# Altium footprint library Common Components.PcbLib: 94 footprints (part 5 of 6)
Each footprint in its own frame and in the unit in brackets; x right, y up, seen from the top. Pads: shape width x height; smd on the part's side, far side on the other; paste and mask are expansions set on the pad; w line width, h text height; cw(c..) or ccw(c..) is an arc to the next point about the centre after c.
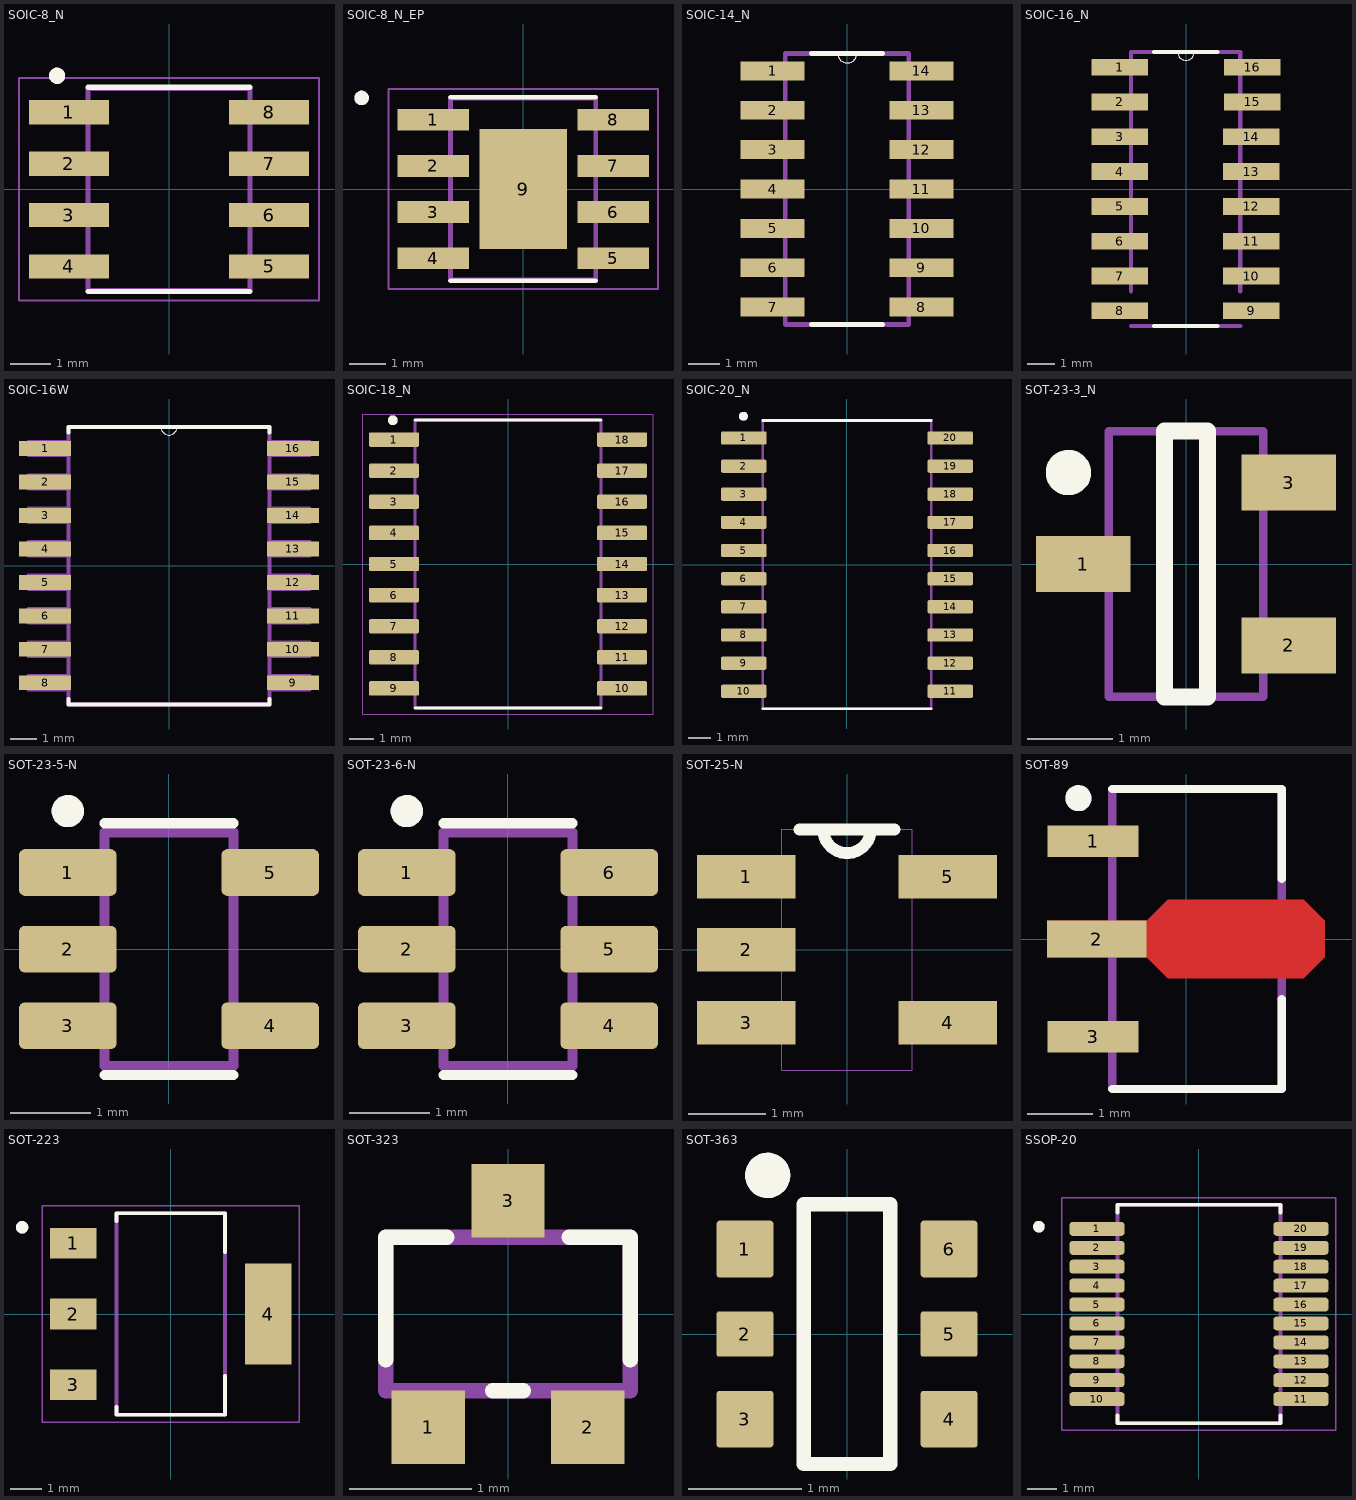
[diagram p4: the footprints below, top view; thin cyan lines are the x and y axes]

## SOIC-8_N [mm]
pads (8):
  rect 1.97x0.6 smd: 1(-2.475,1.905) 2(-2.475,0.635) 3(-2.475,-0.635) 4(-2.475,-1.905) 5(2.475,-1.905) 6(2.475,-0.635) 7(2.475,0.635) 8(2.475,1.905)
Top Overlay:
  circle w0.2: c-2.769,2.81 r0.1
  lines w0.127: -2,-2.525 2,-2.525 ; -2,2.525 2,2.525
Mechanical 13:
  circle w0.2: c-2.769,2.81 r0.1
  circle w0.2: c-2.769,2.81 r0.1
  lines w0.127: -2,-2.5 -2,2.5 ; -2,-2.5 2,-2.5 ; -2,-2.5 -2,2.5 ; -2,-2.5 2,-2.5 ; -2,2.5 2,2.5 ; -2,2.5 2,2.5 ; 2,-2.5 2,2.5 ; 2,-2.5 2,2.5
Mechanical 15:
  lines w0.05: -3.71,-2.75 -3.71,2.75 3.71,2.75 3.71,-2.75 -3.71,-2.75
3D body "SOIC-8.step": height 1.75, standoff 0, extent -3,-2.45 3,2.45

## SOIC-8_N_EP [mm]
pads (9):
  rect 1.97x0.6 smd: 1(-2.475,1.905) 2(-2.475,0.635) 3(-2.475,-0.635) 4(-2.475,-1.905) 5(2.475,-1.905) 6(2.475,-0.635) 7(2.475,0.635) 8(2.475,1.905)
  rect 2.41x3.3 smd: 9(0,0)
Top Overlay:
  circle w0.2: c-4.445,2.505 r0.1
  lines w0.127: -2,-2.525 2,-2.525 ; -2,2.525 2,2.525
Top Paste:
  region: -0.76,1.04 0.76,1.04 0.76,-1.04 -0.76,-1.04
Mechanical 13:
  circle w0.2: c-4.445,2.505 r0.1
  circle w0.2: c-4.445,2.505 r0.1
  lines w0.127: -2,-2.5 -2,2.5 ; -2,-2.5 2,-2.5 ; -2,-2.5 -2,2.5 ; -2,-2.5 2,-2.5 ; -2,2.5 2,2.5 ; -2,2.5 2,2.5 ; 2,-2.5 2,2.5 ; 2,-2.5 2,2.5
Mechanical 15:
  lines w0.05: -3.71,-2.75 -3.71,2.75 3.71,2.75 3.71,-2.75 -3.71,-2.75
3D body "SOIC-8.step": height 1.75, standoff 0, extent -3,-2.45 3,2.45

## SOIC-14_N [mil]
pads (14):
  rect 81x24 smd: 1(-94.5,150) 2(-94.5,100) 3(-94.5,50) 4(-94.5,0) 5(-94.5,-50) 6(-94.5,-100) 7(-94.5,-150) 8(94.5,-150) 9(94.5,-100) 10(94.5,-50) 11(94.5,0) 12(94.5,50) 13(94.5,100) 14(94.5,150)
Top Overlay:
  lines w0: -11.5,172 ccw(c0.5,172) 12.5,172
  lines w6: -45.5,-172 45.5,-172 ; -45.5,172 -11.5,172 12.5,172 45.5,172
Mechanical 13:
  lines w0: -11.5,172 ccw(c0.5,172) 12.5,172 cw(c0.5,172) -11.5,172
  lines w6: -78.5,-172 -78.5,172 ; -78.5,-172 78.5,-172 ; -78.5,-172 -78.5,172 ; -78.5,-172 78.5,-172 ; -78.5,172 -11.5,172 ; -78.5,172 -11.5,172 ; -11.5,172 12.5,172 ; -11.5,172 12.5,172 ; 12.5,172 78.5,172 ; 12.5,172 78.5,172 ; 78.5,-172 78.5,172 ; 78.5,-172 78.5,172 ; -94.5,-150 -78.5,-150 -94.5,-150 ; -94.5,-100 -78.5,-100 -94.5,-100 ; -94.5,-50 -78.5,-50 -94.5,-50 ; -94.5,0 -78.5,0 -94.5,0 ; -94.5,50 -78.5,50 -94.5,50 ; -94.5,100 -78.5,100 -94.5,100 ; -94.5,150 -78.5,150 -94.5,150 ; 78.5,-150 94.5,-150 78.5,-150 ; 78.5,-100 94.5,-100 78.5,-100 ; 78.5,-50 94.5,-50 78.5,-50 ; 78.5,0 94.5,0 78.5,0 ; 78.5,50 94.5,50 78.5,50 ; 78.5,100 94.5,100 78.5,100 ; 78.5,150 94.5,150 78.5,150
3D body "SOIC-14.step": height 68.9, standoff 0, extent -118.11,-172.25 118.11,172.24

## SOIC-16_N [mil]
pads (16):
  rect 81x24 smd: 1(-95,175) 2(-95,125) 3(-95,75) 4(-95,25) 5(-95,-25) 6(-95,-75) 7(-95,-125) 8(-95,-175) 9(94,-175) 10(94,-125) 11(94,-75) 12(94,-25) 13(94,25) 14(94,75) 15(95,125) 16(95,175)
Top Overlay:
  lines w0: -12,197 ccw(c0,197) 12,197
  lines w6: -46,-197 45,-197 ; -46,197 -12,197 12,197 45,197
Mechanical 13:
  lines w0: -12,197 ccw(c0,197) 12,197 cw(c0,197) -12,197
  lines w6: -79,197 -79,-147 -79,197 ; -79,197 -12,197 ; -79,197 -12,197 ; -12,197 12,197 ; -12,197 12,197 ; 12,197 78,197 ; 12,197 78,197 ; 78,197 78,-147 78,197 ; -95,-125 -79,-125 -95,-125 ; -95,-75 -79,-75 -95,-75 ; -95,-25 -79,-25 -95,-25 ; -95,25 -79,25 -95,25 ; -95,75 -79,75 -95,75 ; -95,125 -79,125 -95,125 ; -95,175 -79,175 -95,175 ; -79,-197 78,-197 -79,-197 ; 78,-125 94,-125 78,-125 ; 78,-75 94,-75 78,-75 ; 78,-25 94,-25 78,-25 ; 78,25 94,25 78,25 ; 78,75 94,75 78,75 ; 78,125 94,125 78,125 ; 78,175 94,175 78,175
3D body "SOIC-16.step": height 66.93, standoff 0, extent -118.1,-200.78 118.11,200.79

## SOIC-16W [mil]
pads (16):
  rect 78x22 smd: 1(-185,175) 2(-185,125) 3(-185,75) 4(-185,25) 5(-185,-25) 6(-185,-75) 7(-185,-125) 8(-185,-175) 9(185,-175) 10(185,-125) 11(185,-75) 12(185,-25) 13(185,25) 14(185,75) 15(185,125) 16(185,175)
Top Overlay:
  lines w0: -12,207 ccw(c0,207) 12,207
  lines w6: -150,-199 -150,-207 150,-207 150,-199 ; -150,199 -150,207 -12,207 12,207 150,207 150,199
Mechanical 13:
  lines w0: -12,207 ccw(c0,207) 12,207 cw(c0,207) -12,207
  lines w6: -210,-185 -210,-165 ; -210,-185 -150,-185 ; -210,-185 -210,-165 ; -210,-185 -150,-185 ; -210,-165 -150,-165 ; -210,-165 -150,-165 ; -210,-135 -210,-115 ; -210,-135 -150,-135 ; -210,-135 -210,-115 ; -210,-135 -150,-135 ; -210,-115 -150,-115 ; -210,-115 -150,-115 ; -210,-85 -210,-65 ; -210,-85 -150,-85 ; -210,-85 -210,-65 ; -210,-85 -150,-85 ; -210,-65 -150,-65 ; -210,-65 -150,-65 ; -210,-35 -210,-15 ; -210,-35 -150,-35 ; -210,-35 -210,-15 ; -210,-35 -150,-35 ; -210,-15 -150,-15 ; -210,-15 -150,-15 ; -210,15 -210,35 ; -210,15 -150,15 ; -210,15 -210,35 ; -210,15 -150,15 ; -210,35 -150,35 ; -210,35 -150,35 ; -210,65 -210,85 ; -210,65 -150,65 ; -210,65 -210,85 ; -210,65 -150,65 ; -210,85 -150,85 ; -210,85 -150,85 ; -210,115 -210,135 ; -210,115 -150,115 ; -210,115 -210,135 ; -210,115 -150,115 ; -210,135 -150,135 ; -210,135 -150,135 ; -210,165 -210,185 ; -210,165 -150,165 ; -210,165 -210,185 ; -210,165 -150,165 ; -210,185 -150,185 ; -210,185 -150,185 ; -150,-207 150,-207 ; -150,-207 -150,207 ; -150,-207 150,-207 ; -150,-207 -150,207 ; -150,-185 -150,-165 ; -150,-185 -150,-165 ; -150,-135 -150,-115 ; -150,-135 -150,-115 ; -150,-85 -150,-65 ; -150,-85 -150,-65 ; -150,-35 -150,-15 ; -150,-35 -150,-15 ; -150,15 -150,35 ; -150,15 -150,35 ; -150,65 -150,85 ; -150,65 -150,85 ; -150,115 -150,135 ; -150,115 -150,135 ; -150,165 -150,185 ; -150,165 -150,185 ; -150,207 -12,207 ; -150,207 -12,207 ; -12,207 12,207 ; -12,207 12,207 ; 12,207 150,207 ; 12,207 150,207 ; 150,-207 150,207 ; 150,-207 150,207 ; 150,-185 150,-165 ; 150,-185 210,-185 ; 150,-185 150,-165 ; 150,-185 210,-185 ; 150,-165 210,-165 ; 150,-165 210,-165 ; 150,-135 150,-115 ; 150,-135 210,-135 ; 150,-135 150,-115 ; 150,-135 210,-135 ; 150,-115 210,-115 ; 150,-115 210,-115 ; 150,-85 150,-65 ; 150,-85 210,-85 ; 150,-85 150,-65 ; 150,-85 210,-85 ; 150,-65 210,-65 ; 150,-65 210,-65 ; 150,-35 150,-15 ; 150,-35 210,-35 ; 150,-35 150,-15 ; 150,-35 210,-35 ; 150,-15 210,-15 ; 150,-15 210,-15 ; 150,15 150,35 ; 150,15 210,15 ; 150,15 150,35 ; 150,15 210,15 ; 150,35 210,35 ; 150,35 210,35 ; 150,65 150,85 ; 150,65 210,65 ; 150,65 150,85 ; 150,65 210,65 ; 150,85 210,85 ; 150,85 210,85 ; 150,115 150,135 ; 150,115 210,115 ; 150,115 150,135 ; 150,115 210,115 ; 150,135 210,135 ; 150,135 210,135 ; 150,165 150,185 ; 150,165 210,165 ; 150,165 150,185 ; 150,165 210,165 ; 150,185 210,185 ; 150,185 210,185 ; 210,-185 210,-165 ; 210,-185 210,-165 ; 210,-135 210,-115 ; 210,-135 210,-115 ; 210,-85 210,-65 ; 210,-85 210,-65 ; 210,-35 210,-15 ; 210,-35 210,-15 ; 210,15 210,35 ; 210,15 210,35 ; 210,65 210,85 ; 210,65 210,85 ; 210,115 210,135 ; 210,115 210,135 ; 210,165 210,185 ; 210,165 210,185
3D body "SOIC-16W.step": height 100.89, standoff -3.44, extent -209.24,-206.7 209.26,206.69

## SOIC-18_N [mm]
pads (18):
  rrect25% 2.05x0.59 smd: 1(-4.655,5.08) 2(-4.655,3.81) 3(-4.655,2.54) 4(-4.655,1.27) 5(-4.655,0) 6(-4.655,-1.27) 7(-4.655,-2.54) 8(-4.655,-3.81) 9(-4.655,-5.08) 10(4.655,-5.08) 11(4.655,-3.81) 12(4.655,-2.54) 13(4.655,-1.27) 14(4.655,0) 15(4.655,1.27) 16(4.655,2.54) 17(4.655,3.81) 18(4.655,5.08)
Top Overlay:
  circle w0.2: c-4.705,5.87 r0.1
  lines w0.127: -3.8,-5.875 3.8,-5.875 ; -3.8,5.875 3.8,5.875
Mechanical 13:
  circle w0.2: c-4.705,5.87 r0.1
  lines w0.127: -3.8,-5.875 3.8,-5.875 3.8,5.875 -3.8,5.875 -3.8,-5.875
Mechanical 15:
  lines w0.05: -5.93,-6.125 5.93,-6.125 5.93,6.125 -5.93,6.125 -5.93,-6.125
3D body "SOIC-18.STEP": height 2.61, standoff 0.01, extent -5.3,-5.875 5.3,5.875

## SOIC-20_N [mm]
pads (20):
  rrect25% 2.05x0.6 smd: 1(-4.655,5.715) 2(-4.655,4.445) 3(-4.655,3.175) 4(-4.655,1.905) 5(-4.655,0.635) 6(-4.655,-0.635) 7(-4.655,-1.905) 8(-4.655,-3.175) 9(-4.655,-4.445) 10(-4.655,-5.715) 11(4.655,-5.715) 12(4.655,-4.445) 13(4.655,-3.175) 14(4.655,-1.905) 15(4.655,-0.635) 16(4.655,0.635) 17(4.655,1.905) 18(4.655,3.175) 19(4.655,4.445) 20(4.655,5.715)
Top Overlay:
  circle w0.2: c-4.673,6.696 r0.1
  lines w0.127: -3.8,-6.5 3.8,-6.5 ; -3.8,6.5 3.8,6.5
Mechanical 13:
  circle w0.2: c-4.673,6.696 r0.1
  lines w0.127: -3.8,-6.5 3.8,-6.5 3.8,6.5 -3.8,6.5 -3.8,-6.5
3D body "SOIC-20.step": height 2.24, standoff 0, extent -5.067,-6.3 5.067,6.3

## SOT-23-3_N [mm] "SOT23, 6-Leads, Body 2.9x1.6mm, Pitch 0.95mm, Lead Span 2.7mm, IPC Medium Density"
height 1.45
pads (3):
  rect 1.1x0.65 smd: 1(-1.2,0) 2(1.2,-0.95) 3(1.2,0.95)
Top Overlay:
  circle w0.279: c-1.372,1.067 r0.125
  lines w0.2: -0.25,-1.55 0.25,-1.55 0.25,1.55 -0.25,1.55 -0.25,-1.55
Mechanical 13:
  lines w0.1: -0.9,-1.55 -0.9,1.55 0.9,1.55 0.9,-1.55 -0.9,-1.55
3D body "SOT-23.step": height 1.11, standoff 0.01, extent -1.25,-1.5 1.25,1.5

## SOT-23-5-N [mm]
pads (5):
  rrect25% 1.21x0.58 smd: 1(-1.255,0.95) 2(-1.255,0) 3(-1.255,-0.95) 4(1.255,-0.95) 5(1.255,0.95)
Top Overlay:
  circle w0.2: c-1.255,1.712 r0.1
  lines w0.127: -0.8,-1.56 0.8,-1.56 ; -0.8,1.56 0.8,1.56
Mechanical 13:
  circle w0.2: c-1.255,1.712 r0.1
  lines w0.127: -0.8,-1.45 -0.8,1.45 0.8,1.45 0.8,-1.45 -0.8,-1.45
3D body "SOT-23-5.step": height 1.11, standoff 0.01, extent -1.25,-1.5 1.25,1.5

## SOT-23-6-N [mm]
pads (6):
  rrect25% 1.21x0.58 smd: 1(-1.255,0.95) 2(-1.255,0) 3(-1.255,-0.95) 4(1.255,-0.95) 5(1.255,0) 6(1.255,0.95)
Top Overlay:
  circle w0.2: c-1.255,1.712 r0.1
  lines w0.127: -0.8,-1.56 0.8,-1.56 ; -0.8,1.56 0.8,1.56
Mechanical 13:
  circle w0.2: c-1.255,1.712 r0.1
  lines w0.127: -0.8,-1.45 0.8,-1.45 0.8,1.45 -0.8,1.45 -0.8,-1.45
3D body "SOT-23-6.step": height 1.09, standoff 0, extent -1.219,-1.397 1.207,1.397

## SOT-25-N [mil]
pads (5):
  rect 50x22 smd: 1(-51,37) 2(-51,0) 3(-51,-37) 4(51,-37) 5(51,37)
Top Overlay:
  lines w6: -24,61 -12,61 ; 24,61 12,61 ; -12,61 ccw(c0,61) 12,61 ; -12,61 12,61
Mechanical 13:
  lines w0: -33,-47 -59,-47 -59,-28 -33,-28 ; -33,-47 -33,-28 ; -33,-47 -33,-61 33,-61 33,-47 ; -33,-28 -33,-10 ; -33,-10 -59,-10 -59,10 -33,10 ; -33,-10 -33,10 ; -33,10 -33,28 ; -33,28 -59,28 -59,47 -33,47 ; -33,28 -33,47 ; -33,47 -33,61 -12,61 ; -12,61 ccw(c0,61) 12,61 ; -12,61 12,61 ; 12,61 33,61 33,47 ; 33,-47 59,-47 59,-28 33,-28 ; 33,-47 33,-28 ; 33,-28 33,28 ; 33,28 59,28 59,47 33,47 ; 33,28 33,47
3D body "SOT-25.step": height 43.8, standoff -1.47, extent -50,-59.05 44.49,59.05

## SOT-89 [mm]
pads (3):
  rect 1.4x0.48 smd: 1(-1.425,1.5) 3(-1.425,-1.5)
  rect 1.525x0.56 smd mask+0: 2(-1.365,0)
Top Layer:
  region: 2.125,0.28 2.125,-0.28 1.805,-0.6 -0.28,-0.6 -0.6,-0.28 -2.125,-0.28 -2.125,0.28 -0.6,0.28 -0.28,0.6 1.805,0.6
Top Overlay:
  circle w0.2: c-1.651,2.159 r0.1
  lines w0.127: -1.13,-2.3 1.47,-2.3 1.47,-0.92 ; -1.13,2.3 1.47,2.3 1.47,0.92
Top Paste:
  region: 1.623,-0.38 -0.098,-0.38 -0.098,0.38 1.623,0.38
Top Solder:
  region: 2.225,0.28 2.225,-0.28 1.805,-0.7 -0.28,-0.7 -0.6,-0.38 -2.225,-0.38 -2.225,0.38 -0.6,0.38 -0.28,0.7 1.805,0.7
Mechanical 13:
  circle w0.2: c-1.651,2.159 r0.1
  lines w0.127: -1.13,-2.3 -1.13,2.3 1.47,2.3 1.47,-2.3 -1.13,-2.3
3D body "SOT-89.step": height 1.51, standoff 0.01, extent -1.95,-2.25 2.05,2.25

## SOT-223 [mil]
pads (4):
  rect 59x39 smd: 1(-124,90) 2(-124,0) 3(-124,-90)
  rect 59x129 smd: 4(124,0)
Top Overlay:
  circle w7.87: c-188.98,110.24 r3.94
  lines w5: -69,-118.11 -69,-128.05 69,-128.05 69,-78.74 ; -69,118.11 -69,128.05 69,128.05 69,78.74
Mechanical 13:
  circle w7.87: c-188.98,110.24 r3.94
  lines w5: -69,-128.05 69,-128.05 69,128.05 -69,128.05 -69,-128.05
Mechanical 15:
  lines w1.97: -163.39,-137.89 163.39,-137.89 163.39,137.89 -163.39,137.89 -163.39,-137.89
3D body "SOT-223.step": height 66.64, standoff 0.5, extent -137.01,-127.95 137.01,127.96

## SOT-323 [mm]
pads (3):
  rect 0.6x0.6 smd: 1(-0.65,-0.925) 2(0.65,-0.925) 3(0,0.925)
Top Overlay:
  lines w0.127: -1,-0.375 -1,0.625 -0.5,0.625 ; -0.125,-0.625 0.125,-0.625 ; 0.5,0.625 1,0.625 1,-0.375
Mechanical 13:
  region: 0.8,-0.976 0.501,-0.976 0.501,-0.575 0.8,-0.575
  region: -0.5,-0.976 -0.801,-0.976 -0.801,-0.575 -0.5,-0.575
  region: 0.15,0.575 -0.15,0.575 -0.15,0.975 0.15,0.975
  lines w0.127: -1,-0.625 1,-0.625 1,0.625 -1,0.625 -1,-0.625
3D body "SOT-323.STEP": height 1.11, standoff 0.01, extent -1,-1.05 1,1.05

## SOT-363 [mm]
pads (6):
  rrect10% 0.5x0.5 smd: 1(-0.9,0.75) 3(-0.9,-0.75) 4(0.9,-0.75) 6(0.9,0.75)
  rrect10% 0.5x0.4 smd: 2(-0.9,0) 5(0.9,0)
Top Overlay:
  circle w0.2: c-0.7,1.4 r0.1
  lines w0.127: -0.381,-1.146 -0.381,1.146 0.381,1.146 0.381,-1.146 -0.381,-1.146
3D body "SOT-363.STEP": height 1.01, standoff -0.09, extent -1.05,-1 1.05,1

## SSOP-20 [mm]
pads (20):
  rrect50% 1.9x0.48 smd: 1(-3.505,2.925) 2(-3.505,2.275) 3(-3.505,1.625) 4(-3.505,0.975) 5(-3.505,0.325) 6(-3.505,-0.325) 7(-3.505,-0.975) 8(-3.505,-1.625) 9(-3.505,-2.275) 10(-3.505,-2.925) 11(3.505,-2.925) 12(3.505,-2.275) 13(3.505,-1.625) 14(3.505,-0.975) 15(3.505,-0.325) 16(3.505,0.325) 17(3.505,0.975) 18(3.505,1.625) 19(3.505,2.275) 20(3.505,2.925)
Top Overlay:
  circle w0.2: c-5.5,3 r0.1
  lines w0.127: -2.8,-3.48 -2.8,-3.75 2.8,-3.75 2.8,-3.48 ; -2.8,3.48 -2.8,3.75 2.8,3.75 2.8,3.48
Mechanical 13:
  circle w0.2: c-5.5,3 r0.1
  lines w0.127: -2.8,-3.75 2.8,-3.75 2.8,3.75 -2.8,3.75 -2.8,-3.75
Mechanical 15:
  lines w0.05: -4.71,-4 -4.71,4 4.71,4 4.71,-4 -4.71,-4
3D body "SSOP-20.step": height 1.79, standoff -0.2, extent -3.95,-3.25 3.95,3.25